# Altium footprint library Connectors.PcbLib: 87 footprints (part 2 of 6)
Each footprint in its own frame and in the unit in brackets; x right, y up, seen from the top. Pads: shape width x height; smd on the part's side, far side on the other; paste and mask are expansions set on the pad; w line width, h text height; cw(c..) or ccw(c..) is an arc to the next point about the centre after c.
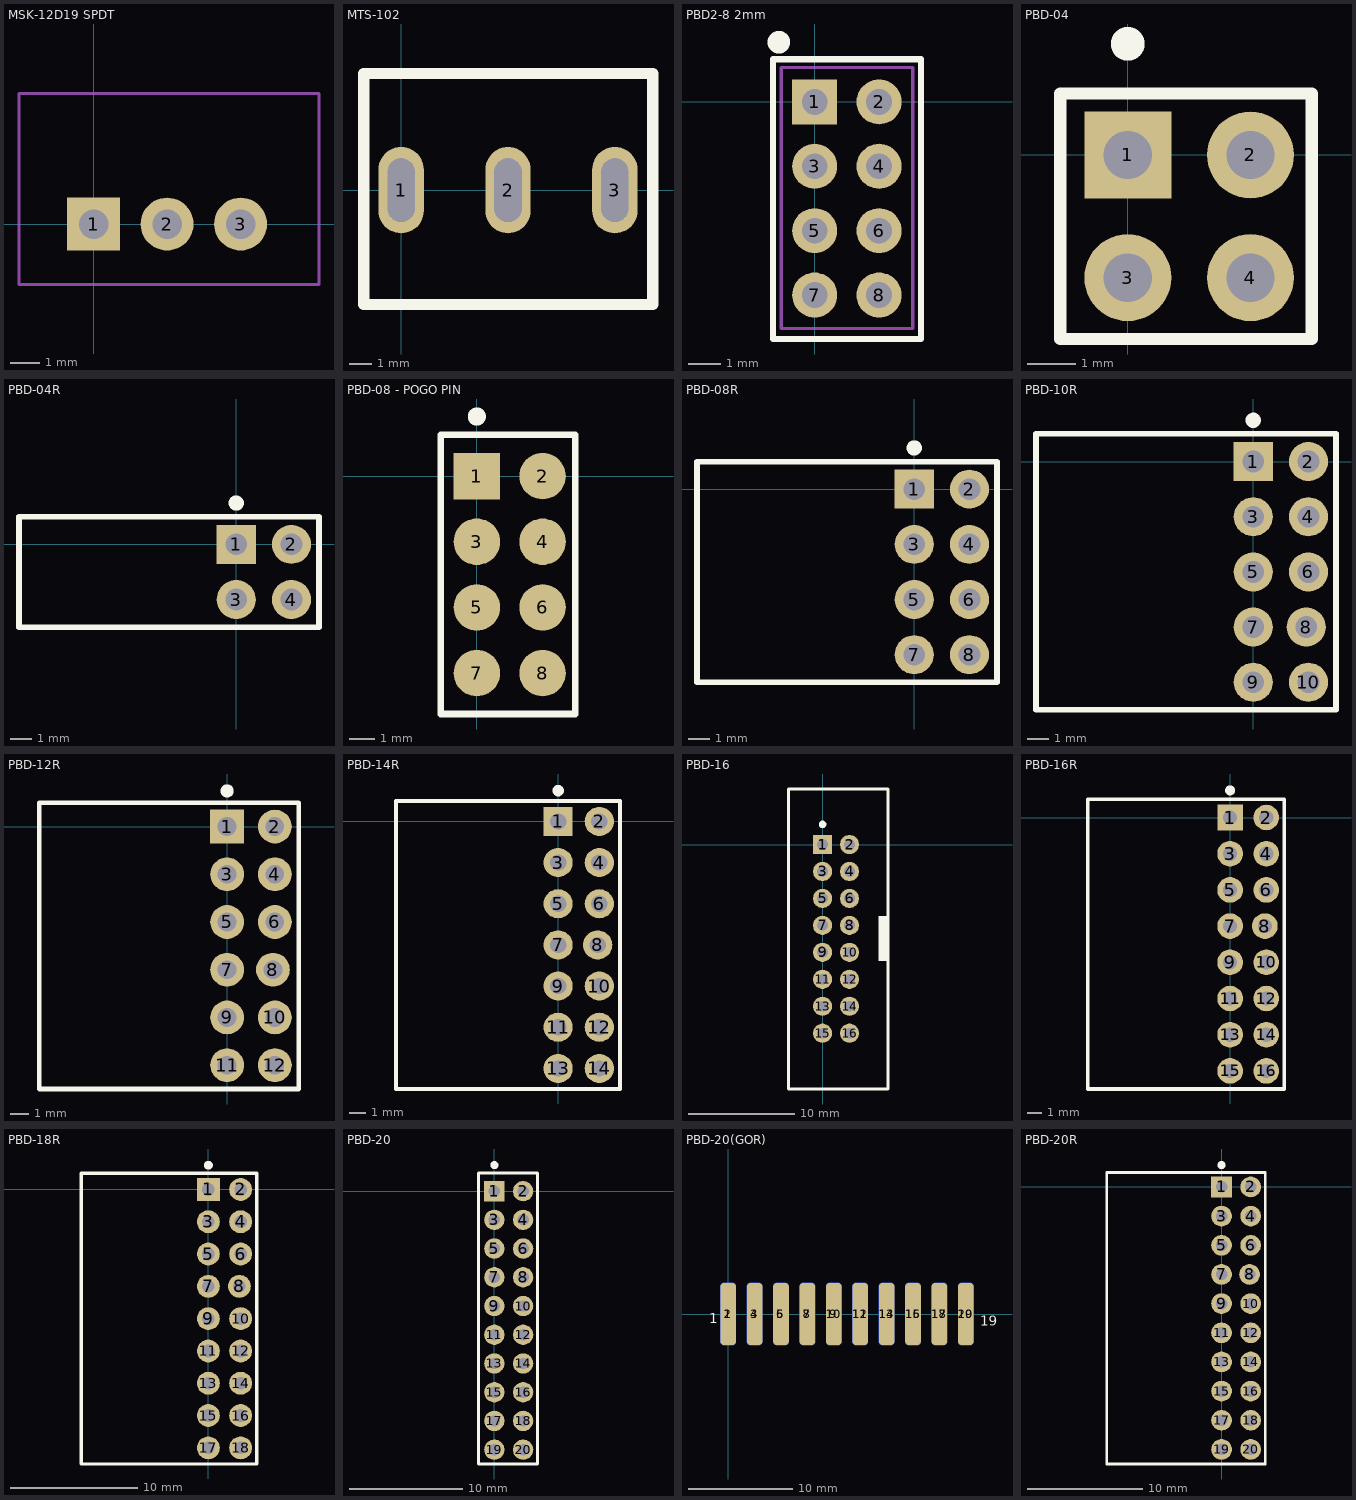
[diagram p1: the footprints below, top view; thin cyan lines are the x and y axes]

## MSK-12D19 SPDT [mm]
pads (3):
  rect 1.8x1.8 hole 1: 1(0,0)
  round 1.8 hole 1: 2(2.5,0) 3(5,0)
Mechanical 29:
  lines w0.1: -2.535,-2.057 7.665,-2.057 7.665,4.444 -2.535,4.444 -2.535,-2.057
  text ".Designator" at 0.5,2 h1
3D body "slide switch spd 3 pin.stp": height 3.65, standoff -4.4, extent -2.535,-2.057 7.665,4.444

## MTS-102 [mm]
height 10
pads (3):
  oval 2x3.8 hole 1.2 slot 2.8 at 90 deg: 1(0,0) 2(4.7,0) 3(9.4,0)
Top Overlay:
  lines w0.5: -1.651,-5.029 11.063,-5.029 11.063,5.131 -1.651,5.131 -1.651,-5.029
3D body "toogle_switch.STEP": height 28.55, standoff -3.83, extent -1.651,-5.029 11.063,5.131

## PBD2-8 2mm [mm]
pads (8):
  rect 1.4x1.4 hole 0.8: 1(0,0)
  round 1.4 hole 0.8: 2(2,0) 3(0,-2) 4(2,-2) 5(0,-4) 6(2,-4) 7(0,-6) 8(2,-6)
Top Overlay:
  circle w0.5: c-1.118,1.854 r0.1
  lines w0.2: -1.295,-7.366 3.302,-7.366 3.302,1.321 -1.295,1.321 -1.295,-7.366
Mechanical 29:
  lines w0.1: -1.041,-7.036 -1.041,1.067 3.048,1.067 3.048,-7.036 -1.041,-7.036
  text ".Designator" at 1.422,-6.909 h2
3D body "User Library-PBD2-8.step": height 4.7, standoff -2.95, extent -0.991,-6.984 3.009,1.016

## PBD-04 [mm]
pads (4):
  rect 1.8x1.8 hole 1: 1(0,0)
  round 1.8 hole 1: 2(2.54,0) 3(0,-2.54) 4(2.54,-2.54)
Top Overlay:
  circle w0.5: c0,2.3 r0.1
  lines w0.254: -1.4,-3.81 3.81,-3.81 3.81,1.27 -1.4,1.27 -1.4,-3.81
3D body "PBD2-2(2.54mm).STEP": height 8.4, standoff -2.7, extent -1.24,-3.81 3.84,1.27

## PBD-04R [mm]
pads (4):
  rect 1.8x1.8 hole 1: 1(0,0)
  round 1.8 hole 1: 2(2.54,0) 3(0,-2.54) 4(2.54,-2.54)
Top Overlay:
  circle w0.5: c0,1.9 r0.1
  lines w0.254: -10,-3.81 -10,1.27 3.81,1.27 3.81,-3.81 -10,-3.81
3D body "PBD-04R.step": height 5, standoff -3, extent -10,-3.81 3,1.27

## PBD-08 - POGO PIN [mm]
pads (8):
  rect 1.8x1.8 smd: 1(0,0)
  round 1.8 smd: 2(2.54,0) 3(0,-2.54) 4(2.54,-2.54) 5(0,-5.08) 6(2.54,-5.08) 7(0,-7.62) 8(2.54,-7.62)
Top Overlay:
  circle w0.5: c0,2.3 r0.1
  lines w0.254: -1.4,-9.2 -1.4,1.6 3.81,1.6 3.81,-9.2 -1.4,-9.2
Mechanical 29:
  lines w0.1: -1.4,-9.2 3.81,-9.2 3.81,1.6 -1.4,1.6 -1.4,-9.2
  text ".Designator" at -0.7,3.1 h2

## PBD-08R [mm]
pads (8):
  rect 1.8x1.8 hole 1: 1(0,0)
  round 1.8 hole 1: 2(2.54,0) 3(0,-2.54) 4(2.54,-2.54) 5(0,-5.08) 6(2.54,-5.08) 7(0,-7.62) 8(2.54,-7.62)
Top Overlay:
  circle w0.5: c0,1.9 r0.1
  lines w0.254: -10,-8.89 -10,1.27 3.81,1.27 3.81,-8.89 -10,-8.89
3D body "PBD-04R.step": height 5, standoff -3, extent -10,-8.89 3,-3.81
3D body "PBD-04R.step": height 5, standoff -3, extent -10,-3.81 3,1.27

## PBD-10R [mm]
pads (10):
  rect 1.8x1.8 hole 1: 1(0,0)
  round 1.8 hole 1: 2(2.54,0) 3(0,-2.54) 4(2.54,-2.54) 5(0,-5.08) 6(2.54,-5.08) 7(0,-7.62) 8(2.44,-7.62) 9(0,-10.16) 10(2.54,-10.16)
Top Overlay:
  circle w0.5: c0,1.9 r0.1
  lines w0.254: -10,-11.43 3.81,-11.43 3.81,1.27 -10,1.27 -10,-11.43
3D body "PBD-04R.step": height 5, standoff -3, extent -10,-3.81 3,1.27
3D body "PBD-04R.step": height 5, standoff -3, extent -10,-8.89 3,-3.81
3D body "PBD-04R.step": height 5, standoff -3, extent -10,-11.43 3,-6.35

## PBD-12R [mm]
pads (12):
  rect 1.8x1.8 hole 1: 1(0,0)
  round 1.8 hole 1: 2(2.54,0) 3(0,-2.54) 4(2.54,-2.54) 5(0,-5.08) 6(2.54,-5.08) 7(0,-7.62) 8(2.44,-7.62) 9(0,-10.16) 10(2.54,-10.16) 11(0,-12.7) 12(2.54,-12.7)
Top Overlay:
  circle w0.5: c0,1.9 r0.1
  lines w0.254: -10,-13.97 3.81,-13.97 3.81,1.27 -10,1.27 -10,-13.97
3D body "PBD-04R.step": height 5, standoff -3, extent -10,-3.81 3,1.27
3D body "PBD-04R.step": height 5, standoff -3, extent -10,-8.89 3,-3.81
3D body "PBD-04R.step": height 5, standoff -3, extent -10,-13.97 3,-8.89

## PBD-14R [mm]
pads (14):
  rect 1.8x1.8 hole 1: 1(0,0)
  round 1.8 hole 1: 2(2.54,0) 3(0,-2.54) 4(2.54,-2.54) 5(0,-5.08) 6(2.54,-5.08) 7(0,-7.62) 8(2.44,-7.62) 9(0,-10.16) 10(2.54,-10.16) 11(0,-12.7) 12(2.54,-12.7) 13(0,-15.24) 14(2.54,-15.24)
Top Overlay:
  circle w0.5: c0,1.9 r0.1
  lines w0.254: -10,-16.51 -10,1.27 3.81,1.27 3.81,-16.51 -10,-16.51
3D body "PBD-04R.step": height 5, standoff -3, extent -10,-13.97 3,-8.89
3D body "PBD-04R.step": height 5, standoff -3, extent -10,-8.89 3,-3.81
3D body "PBD-04R.step": height 5, standoff -3, extent -10,-3.81 3,1.27
3D body "PBD-04R.step": height 5, standoff -3, extent -10,-16.51 3,-11.43

## PBD-16 [mm]
pads (16):
  rect 1.8x1.8 hole 1: 1(0,0)
  round 1.8 hole 1: 2(2.54,0) 3(0,-2.54) 4(2.54,-2.54) 5(0,-5.08) 6(2.54,-5.08) 7(0,-7.62) 8(2.54,-7.62) 9(0,-10.16) 10(2.54,-10.16) 11(0,-12.7) 12(2.54,-12.7) 13(0,-15.24) 14(2.54,-15.24) 15(0,-17.78) 16(2.54,-17.78)
Top Overlay:
  circle w0.5: c0,1.9 r0.1
  region: 6.117,-10.984 6.117,-6.734 5.25,-6.734 5.25,-10.984
  lines w0.254: -3.2,-23.038 -3.2,5.232 6.172,5.232 6.172,-23.038 -3.2,-23.038
3D body "User Library-User Library-IDC-16M.STEP": height 9.3, standoff -3.1, extent -3.43,-22.89 5.67,5.11

## PBD-16R [mm]
pads (16):
  rect 1.8x1.8 hole 1: 1(0,0)
  round 1.8 hole 1: 2(2.54,0) 3(0,-2.54) 4(2.54,-2.54) 5(0,-5.08) 6(2.54,-5.08) 7(0,-7.62) 8(2.44,-7.62) 9(0,-10.16) 10(2.54,-10.16) 11(0,-12.7) 12(2.54,-12.7) 13(0,-15.24) 14(2.54,-15.24) 15(0,-17.78) 16(2.54,-17.78)
Top Overlay:
  circle w0.5: c0,1.9 r0.1
  lines w0.254: -10,-19.05 3.81,-19.05 3.81,1.27 -10,1.27 -10,-19.05
3D body "PBD-04R.step": height 5, standoff -3, extent -10,-19.05 3,-13.97
3D body "PBD-04R.step": height 5, standoff -3, extent -10,-3.81 3,1.27
3D body "PBD-04R.step": height 5, standoff -3, extent -10,-8.89 3,-3.81
3D body "PBD-04R.step": height 5, standoff -3, extent -10,-13.97 3,-8.89

## PBD-18R [mm]
pads (18):
  rect 1.8x1.8 hole 1: 1(0,0)
  round 1.8 hole 1: 2(2.54,0) 3(0,-2.54) 4(2.54,-2.54) 5(0,-5.08) 6(2.54,-5.08) 7(0,-7.62) 8(2.44,-7.62) 9(0,-10.16) 10(2.54,-10.16) 11(0,-12.7) 12(2.54,-12.7) 13(0,-15.24) 14(2.54,-15.24) 15(0,-17.78) 16(2.54,-17.78) 17(0,-20.32) 18(2.54,-20.32)
Top Overlay:
  circle w0.5: c0,1.9 r0.1
  lines w0.254: -10,-21.59 3.81,-21.59 3.81,1.27 -10,1.27 -10,-21.59
3D body "PBD-04R.step": height 5, standoff -3, extent -10,-21.59 3,-16.51
3D body "PBD-04R.step": height 5, standoff -3, extent -10,-19.05 3,-13.97
3D body "PBD-04R.step": height 5, standoff -3, extent -10,-3.81 3,1.27
3D body "PBD-04R.step": height 5, standoff -3, extent -10,-8.89 3,-3.81
3D body "PBD-04R.step": height 5, standoff -3, extent -10,-13.97 3,-8.89

## PBD-20 [mm]
pads (20):
  rect 1.8x1.8 hole 1: 1(0,0)
  round 1.8 hole 1: 2(2.54,0) 3(0,-2.54) 4(2.54,-2.54) 5(0,-5.08) 6(2.54,-5.08) 7(0,-7.62) 8(2.54,-7.62) 9(0,-10.16) 10(2.54,-10.16) 11(0,-12.7) 12(2.54,-12.7) 13(0,-15.24) 14(2.54,-15.24) 15(0,-17.78) 16(2.54,-17.78) 17(0,-20.32) 18(2.54,-20.32) 19(0,-22.86) 20(2.54,-22.86)
Top Overlay:
  circle w0.5: c0,2.3 r0.1
  lines w0.254: -1.4,-24.13 3.81,-24.13 3.81,1.6 -1.4,1.6 -1.4,-24.13
3D body "PBD2_54-8.step": height 8.5, standoff -3, extent -1.27,-24.33 3.73,-3.51
3D body "PBD2_54-8.step": height 8.5, standoff -3, extent -1.27,-19.25 3.73,1.57

## PBD-20(GOR) [mm]
pads (20):
  rrect50% 1.5x6 smd: 1(0,0) 3(2.54,0) 5(5.08,0) 7(7.62,0) 9(10.16,0) 11(12.7,0) 13(15.24,0) 15(17.78,0) 17(20.32,0) 19(22.86,0)
  rrect50% 1.5x6 smd far side: 2(0,0) 4(2.54,0) 6(5.08,0) 8(7.62,0) 10(10.16,0) 12(12.7,0) 14(15.24,0) 16(17.78,0) 18(20.32,0) 20(22.86,0)
Top Overlay:
  text "19" at 24.232,-1.473 h1.6
  text "1" at -1.829,-1.245 h1.6
Bottom Overlay:
  text "20" at 25.781,-1.473 h1.6
  text "2" at -1.168,-1.27 h1.6
3D body "PBD2_54-8.step": height 1.6, standoff -3.4, extent -1.52,0.81 19.3,12.31
3D body "PBD2_54-8.step": height 1.6, standoff -3.4, extent 3.56,0.81 24.38,12.31

## PBD-20R [mm]
pads (20):
  rect 1.8x1.8 hole 1: 1(0,0)
  round 1.8 hole 1: 2(2.54,0) 3(0,-2.54) 4(2.54,-2.54) 5(0,-5.08) 6(2.54,-5.08) 7(0,-7.62) 8(2.44,-7.62) 9(0,-10.16) 10(2.54,-10.16) 11(0,-12.7) 12(2.54,-12.7) 13(0,-15.24) 14(2.54,-15.24) 15(0,-17.78) 16(2.54,-17.78) 17(0,-20.32) 18(2.54,-20.32) 19(0,-22.86) 20(2.54,-22.86)
Top Overlay:
  circle w0.5: c0,1.9 r0.1
  lines w0.254: -10,-24.13 3.81,-24.13 3.81,1.27 -10,1.27 -10,-24.13
3D body "PBD-04R.step": height 5, standoff -3, extent -10,-24.13 3,-19.05
3D body "PBD-04R.step": height 5, standoff -3, extent -10,-19.05 3,-13.97
3D body "PBD-04R.step": height 5, standoff -3, extent -10,-3.81 3,1.27
3D body "PBD-04R.step": height 5, standoff -3, extent -10,-8.89 3,-3.81
3D body "PBD-04R.step": height 5, standoff -3, extent -10,-13.97 3,-8.89